# Altium footprint library Library.PcbLib: 298 footprints (part 9 of 19)
Each footprint in its own frame and in the unit in brackets; x right, y up, seen from the top. Pads: shape width x height; smd on the part's side, far side on the other; paste and mask are expansions set on the pad; w line width, h text height; cw(c..) or ccw(c..) is an arc to the next point about the centre after c.
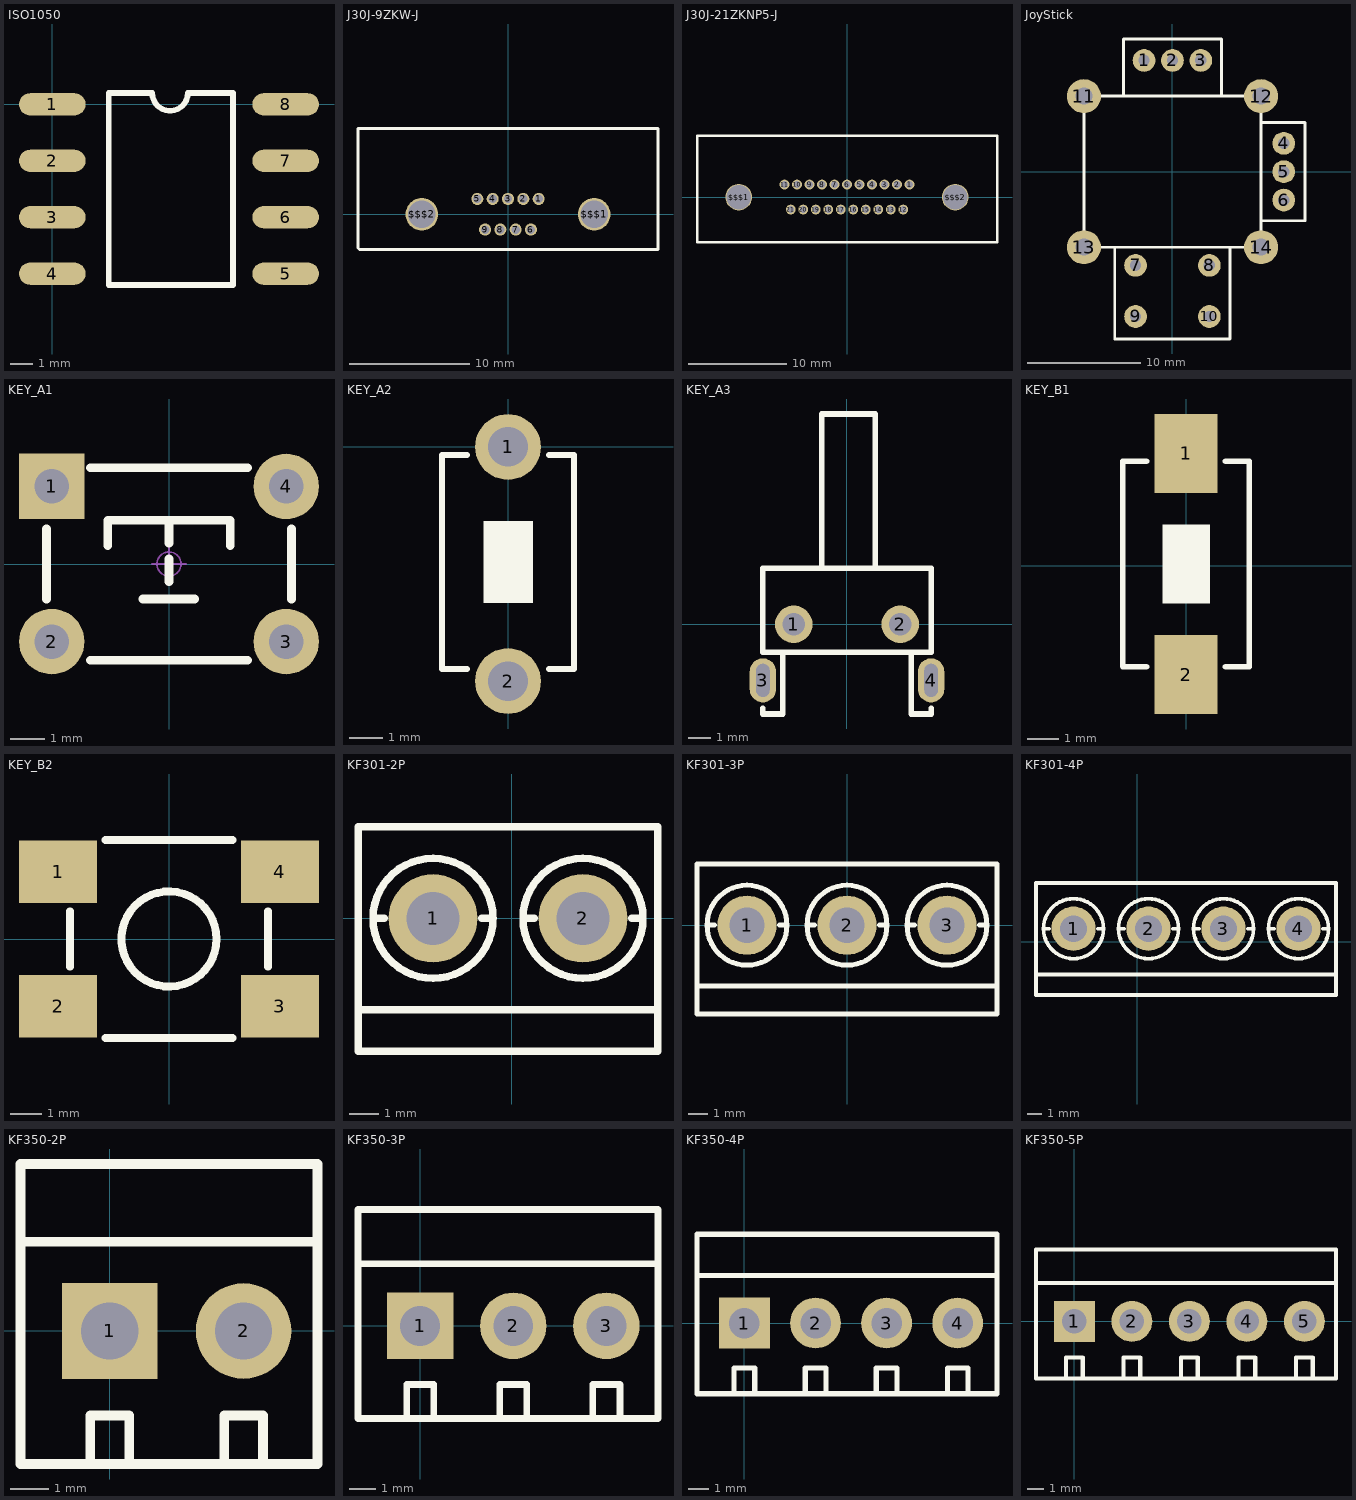
[diagram p8: the footprints below, top view; thin cyan lines are the x and y axes]

## ISO1050 [mm]
pads (8):
  oval 3x1 smd: 1(0.001,0) 2(0.001,-2.54) 3(0.001,-5.08) 4(0.001,-7.62) 5(10.501,-7.62) 6(10.501,-5.08) 7(10.501,-2.54) 8(10.501,0)
Top Overlay:
  lines w0.254: 2.541,-8.128 8.129,-8.128 8.129,0.508 6.097,0.508 cw(c5.297,0.508) 4.497,0.508 2.541,0.508 2.541,-8.128

## J30J-9ZKW-J [mm]
pads (11):
  round 1 hole 0.7: 1(2.54,1.27) 2(1.27,1.27) 3(0,1.27) 4(-1.27,1.27) 5(-2.54,1.27) 6(1.905,-1.27) 7(0.635,-1.27) 8(-0.635,-1.27) 9(-1.905,-1.27)
  round 2.7 hole 2.3: $$$1(7.15,0) $$$2(-7.15,0)
Top Overlay:
  lines w0.254: -12.446,-2.794 -12.319,-2.921 12.446,-2.921 12.446,7.112 -12.446,7.112 -12.446,-2.794

## J30J-21ZKNP5-J [mm]
pads (23):
  round 1 hole 0.7: 1(6.35,1.27) 2(5.08,1.27) 3(3.81,1.27) 4(2.54,1.27) 5(1.27,1.27) 6(0,1.27) 7(-1.27,1.27) 8(-2.54,1.27) 9(-3.81,1.27) 10(-5.08,1.27) 11(-6.35,1.27) 12(5.715,-1.27) 13(4.445,-1.27) 14(3.175,-1.27) 15(1.905,-1.27) 16(0.635,-1.27) 17(-0.635,-1.27) 18(-1.905,-1.27) 19(-3.175,-1.27) 20(-4.445,-1.27) 21(-5.715,-1.27)
  round 2.7 hole 2.5: $$$1(-11,0) $$$2(11,0)
Top Overlay:
  lines w0.254: -10.795,6.223 14.097,6.223 ; -10.414,6.223 -15.24,6.223 -15.24,4.826 -15.24,5.08 -15.24,-2.794 -15.24,-4.572 -9.398,-4.572 ; -9.779,-4.572 14.986,-4.572 15.24,-4.572 15.24,-2.54 ; 13.716,6.223 15.24,6.223 15.24,4.699 ; 15.24,-2.921 15.24,5.08

## JoyStick [mm] "ģ?"
height 20
pads (14):
  round 2 hole 1: 1(-2.5,9.8) 2(0,9.8) 3(2.5,9.8) 4(9.8,2.5) 5(9.8,0) 6(9.8,-2.5) 7(-3.25,-8.25) 8(3.25,-8.25) 9(-3.25,-12.75) 10(3.25,-12.75)
  round 3 hole 1.5: 11(-7.8,6.65) 12(7.8,6.65) 13(-7.8,-6.65) 14(7.8,-6.65)
Top Overlay:
  lines w0.254: -5.08,-6.65 -5.08,-14.732 5.08,-14.732 5.08,-6.65 ; -4.318,6.65 -4.318,11.684 4.318,11.684 4.318,6.65 ; 7.8,-4.318 11.684,-4.318 11.684,4.318 7.8,4.318 ; -7.8,-6.65 -7.8,6.65 7.8,6.65 7.8,-6.65 -7.8,-6.65

## KEY_A1 [mm]
pads (4):
  rect 1.9x1.9 hole 1: 1(-3.4,2.25)
  round 1.9 hole 1: 2(-3.4,-2.25) 3(3.4,-2.25) 4(3.4,2.25)
Top Overlay:
  lines w0.254: -3.556,-1.016 -3.556,1.016 ; -2.286,-2.794 2.286,-2.794 ; -2.286,2.794 2.286,2.794 ; -1.778,0.533 -1.778,1.27 1.778,1.27 1.778,0.533 ; -0.762,-1.016 0.737,-1.016 ; 0,-0.508 0,0.152 ; 0,0.61 0,1.27 ; 3.556,-1.016 3.556,1.016
Bottom Overlay:
  lines w0.254: -2.286,-2.286 2.286,-2.286 ; -2.286,2.286 2.286,2.286
Mechanical 15:
  circle w0.05: c0,0 r0.35
  lines w0.05: -0.5,0 0.5,0 ; 0,-0.5 0,0.5
3D body "TSW DIP-6x6x7.STEP": height 6.95, standoff -3.45, extent -4.106,-3 4.106,3

## KEY_A2 [mm]
pads (2):
  round 2 hole 1.2: 1(0,0) 2(0,-7.112)
Top Overlay:
  region: -0.747,-2.247 -0.747,-4.747 0.753,-4.747 0.753,-2.247
  lines w0.178: -1.25,-6.75 -2,-6.746 -2,-0.25 -1.25,-0.25 ; 1.25,-6.75 2,-6.75 2,-0.25 1.25,-0.25

## KEY_A3 [mm]
height 8
pads (4):
  round 1.7 hole 1: 1(-2.413,0) 2(2.413,0)
  oval 1.2x2 hole 0.6 slot 1.5 at 90 deg: 3(-3.81,-2.54) 4(3.81,-2.54)
Top Overlay:
  lines w0.25: -3.81,-3.81 -3.81,-4.064 -2.921,-4.064 -2.921,-1.27 ; -1.143,2.54 -1.143,9.525 1.27,9.525 1.27,2.54 ; 2.921,-1.27 2.921,-4.064 3.81,-4.064 3.81,-3.81 ; -3.81,-1.27 -3.81,2.54 3.81,2.54 3.81,-1.27 -3.81,-1.27

## KEY_B1 [mm]
pads (2):
  rect 2x2.5 smd: 1(0,3.556) 2(0,-3.444)
Top Overlay:
  region: -0.747,1.309 -0.747,-1.191 0.753,-1.191 0.753,1.309
  lines w0.178: -1.25,-3.194 -2,-3.19 -2,3.306 -1.25,3.306 ; 1.25,-3.194 2,-3.194 2,3.306 1.25,3.306
3D body: height 1.2, standoff 0.8, extent -0.762,-1.143 0.762,1.27
3D body: height 0.8, standoff 0, extent -2.032,-3.175 2.032,3.302

## KEY_B2 [mm]
pads (4):
  rect 2.5x2 smd: 1(-3.556,2.159) 2(-3.556,-2.159) 3(3.556,-2.159) 4(3.556,2.159)
Top Overlay:
  circle w0.254: c0,0 r1.524
  lines w0.25: -3.175,-0.889 -3.175,0.889 ; -2.032,-3.175 2.032,-3.175 ; -2.032,3.175 2.032,3.175 ; 3.175,-0.889 3.175,0.889
3D body: height 1.5, standoff 0, extent -3.175,-3.175 3.175,3.175
3D body: height 6, standoff 0, extent -1.524,-1.524 1.524,1.524

## KF301-2P [mm] "电机接线端子"
pads (2):
  round 3 hole 1.8: 1(-2.667,0) 2(2.413,0)
Top Overlay:
  circle w0.254: c2.413,0 r2.032
  circle w0.254: c-2.667,0 r2.032
  lines w0.254: -5.207,-3.1 4.953,-3.1 ; -4.699,0 -4.318,0 ; -1.016,0 -0.635,0 ; 0.381,0 0.762,0 ; 4.064,0 4.445,0 ; -5.207,-4.5 4.953,-4.5 4.953,3.1 -5.207,3.1 -5.207,-4.5
3D body "User Library-Terminal-Screw-3A-2way.STEP": height 10, standoff -3, extent -5.127,-4.664 5.473,2.936

## KF301-3P [mm]
pads (3):
  round 3 hole 1.8: 1(-5.08,0) 2(0,0) 3(5.08,0)
Top Overlay:
  circle w0.254: c5.08,0 r2.032
  circle w0.254: c0,0 r2.032
  circle w0.254: c-5.08,0 r2.032
  lines w0.254: -7.62,-3.1 7.62,-3.1 ; -7.112,0 -6.731,0 ; -3.429,0 -3.048,0 ; -2.032,0 -1.651,0 ; 1.651,0 2.032,0 ; 3.048,0 3.429,0 ; 6.731,0 7.112,0 ; -7.62,-4.5 7.62,-4.5 7.62,3.1 -7.62,3.1 -7.62,-4.5

## KF301-4P [mm]
pads (4):
  round 3 hole 1.8: 1(-4.318,0.889) 2(0.762,0.889) 3(5.842,0.889) 4(10.922,0.889)
Top Overlay:
  circle w0.254: c-4.318,0.889 r2.032
  circle w0.254: c0.762,0.889 r2.032
  circle w0.254: c10.922,0.889 r2.032
  circle w0.254: c5.842,0.889 r2.032
  lines w0.254: -6.858,-2.211 13.462,-2.211 ; -6.35,0.889 -5.969,0.889 ; -2.667,0.889 -2.286,0.889 ; -1.27,0.889 -0.889,0.889 ; 2.413,0.889 2.794,0.889 ; 3.81,0.889 4.191,0.889 ; 7.493,0.889 7.874,0.889 ; 8.89,0.889 9.271,0.889 ; 12.573,0.889 12.954,0.889 ; -6.858,-3.611 -6.858,3.989 13.462,3.989 13.462,-3.611 -6.858,-3.611

## KF350-2P [mm] "可拼接端子/10A"
pads (2):
  rect 2.5x2.5 hole 1.5: 1(0,0)
  round 2.5 hole 1.5: 2(3.5,0)
Top Overlay:
  lines w0.254: -2.337,2.337 5.436,2.337 ; -0.508,-3.48 -0.508,-2.21 0.508,-2.21 0.508,-3.48 ; 2.992,-3.48 2.992,-2.21 4.008,-2.21 4.008,-3.48 ; -2.337,-3.48 5.436,-3.48 5.436,4.369 -2.337,4.369 -2.337,-3.48
3D body "KF350.STEP": height 10, standoff -3.8, extent -2.15,-3.3 1.75,4.2
3D body "KF350.STEP": height 10, standoff -3.8, extent 1.35,-3.3 5.25,4.2

## KF350-3P [mm] "可拼接端子/10A"
pads (3):
  rect 2.5x2.5 hole 1.5: 1(0,0)
  round 2.5 hole 1.5: 2(3.5,0) 3(7,0)
Top Overlay:
  lines w0.254: -2.337,2.337 8.941,2.337 ; -0.508,-3.48 -0.508,-2.21 0.508,-2.21 0.508,-3.48 ; 2.992,-3.48 2.992,-2.21 4.008,-2.21 4.008,-3.48 ; 6.492,-3.48 6.492,-2.21 7.508,-2.21 7.508,-3.48 ; -2.337,-3.48 8.941,-3.48 8.941,4.369 -2.337,4.369 -2.337,-3.48
3D body "KF350.STEP": height 10, standoff -3.8, extent 4.85,-3.3 8.75,4.2
3D body "KF350.STEP": height 10, standoff -3.8, extent -2.15,-3.3 1.75,4.2
3D body "KF350.STEP": height 10, standoff -3.8, extent 1.35,-3.3 5.25,4.2

## KF350-4P [mm] "可拼接端子/10A"
pads (4):
  rect 2.5x2.5 hole 1.5: 1(0,0)
  round 2.5 hole 1.5: 2(3.5,0) 3(7,0) 4(10.5,0)
Top Overlay:
  lines w0.254: -2.337,2.337 12.436,2.337 ; -0.508,-3.48 -0.508,-2.21 0.508,-2.21 0.508,-3.48 ; 2.992,-3.48 2.992,-2.21 4.008,-2.21 4.008,-3.48 ; 6.492,-3.48 6.492,-2.21 7.508,-2.21 7.508,-3.48 ; 9.992,-3.48 9.992,-2.21 11.008,-2.21 11.008,-3.48 ; -2.337,-3.48 12.436,-3.48 12.436,4.369 -2.337,4.369 -2.337,-3.48
3D body "KF350.STEP": height 10, standoff -3.8, extent 8.35,-3.3 12.25,4.2
3D body "KF350.STEP": height 10, standoff -3.8, extent 4.85,-3.3 8.75,4.2
3D body "KF350.STEP": height 10, standoff -3.8, extent 1.35,-3.3 5.25,4.2
3D body "KF350.STEP": height 10, standoff -3.8, extent -2.15,-3.3 1.75,4.2

## KF350-5P [mm] "可拼接端子/10A"
pads (5):
  rect 2.5x2.5 hole 1.5: 1(0,0)
  round 2.5 hole 1.5: 2(3.5,0) 3(7,0) 4(10.5,0) 5(14,0)
Top Overlay:
  lines w0.254: -2.337,2.337 15.926,2.337 ; -0.508,-3.48 -0.508,-2.21 0.508,-2.21 0.508,-3.48 ; 2.992,-3.48 2.992,-2.21 4.008,-2.21 4.008,-3.48 ; 6.492,-3.48 6.492,-2.21 7.508,-2.21 7.508,-3.48 ; 9.992,-3.48 9.992,-2.21 11.008,-2.21 11.008,-3.48 ; 13.492,-3.48 13.492,-2.21 14.508,-2.21 14.508,-3.48 ; -2.337,-3.48 15.926,-3.48 15.926,4.369 -2.337,4.369 -2.337,-3.48
3D body "KF350.STEP": height 10, standoff -3.8, extent 11.85,-3.3 15.75,4.2
3D body "KF350.STEP": height 10, standoff -3.8, extent 8.35,-3.3 12.25,4.2
3D body "KF350.STEP": height 10, standoff -3.8, extent 4.85,-3.3 8.75,4.2
3D body "KF350.STEP": height 10, standoff -3.8, extent 1.35,-3.3 5.25,4.2
3D body "KF350.STEP": height 10, standoff -3.8, extent -2.15,-3.3 1.75,4.2